# Altium footprint library RPi.PcbLib: 4 footprints
Each footprint in its own frame and in the unit in brackets; x right, y up, seen from the top. Pads: shape width x height; smd on the part's side, far side on the other; paste and mask are expansions set on the pad; w line width, h text height; cw(c..) or ccw(c..) is an arc to the next point about the centre after c.
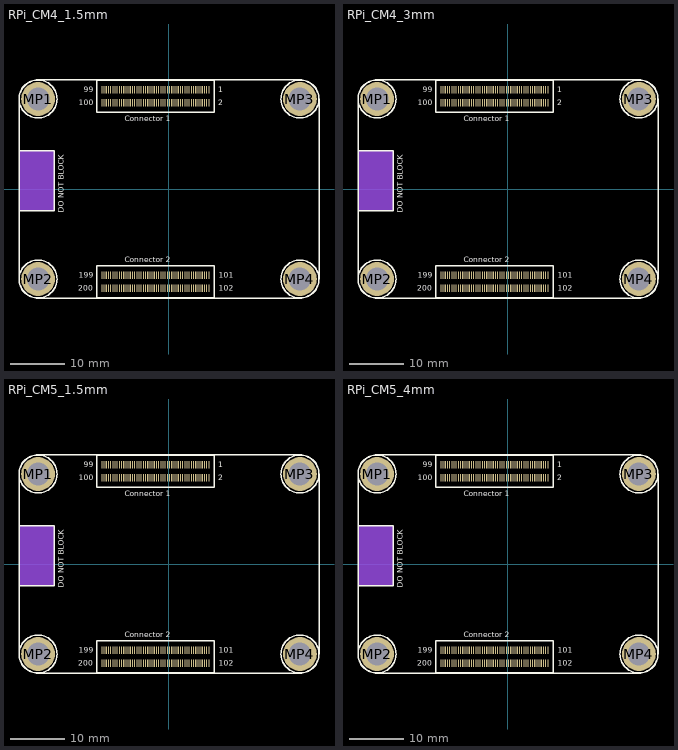
[diagram p0: the footprints below, top view; thin cyan lines are the x and y axes]

## RPi_CM4_1.5mm [mm] "Raspberry Pi compute module 4 footprint with mounting holes for SMTSO-M25-XET series. It is to be used with two DF40C-100DS-0.4v connectors."
pads (204):
  rect 0.2x1.4 smd paste+0 mask+0: 1(7.3,18.2) 2(7.3,15.82) 3(6.9,18.2) 4(6.9,15.82) 5(6.5,18.2) 6(6.5,15.82) 7(6.1,18.2) 8(6.1,15.82) 9(5.7,18.2) 10(5.7,15.82) 11(5.3,18.2) 12(5.3,15.82) 13(4.9,18.2) 14(4.9,15.82) 15(4.5,18.2) 16(4.5,15.82) 17(4.1,18.2) 18(4.1,15.82) 19(3.7,18.2) 20(3.7,15.82) 21(3.3,18.2) 22(3.3,15.82) 23(2.9,18.2) 24(2.9,15.82) 25(2.5,18.2) 26(2.5,15.82) 27(2.1,18.2) 28(2.1,15.82) 29(1.7,18.2) 30(1.7,15.82) 31(1.3,18.2) 32(1.3,15.82) 33(0.9,18.2) 34(0.9,15.82) 35(0.5,18.2) 36(0.5,15.82) 37(0.1,18.2) 38(0.1,15.82) 39(-0.3,18.2) 40(-0.3,15.82) 41(-0.7,18.2) 42(-0.7,15.82) 43(-1.1,18.2) 44(-1.1,15.82) 45(-1.5,18.2) 46(-1.5,15.82) 47(-1.9,18.2) 48(-1.9,15.82) 49(-2.3,18.2) 50(-2.3,15.82) 51(-2.7,18.2) 52(-2.7,15.82) 53(-3.1,18.2) 54(-3.1,15.82) 55(-3.5,18.2) 56(-3.5,15.82) 57(-3.9,18.2) 58(-3.9,15.82) 59(-4.3,18.2) 60(-4.3,15.82) 61(-4.7,18.2) 62(-4.7,15.82) 63(-5.1,18.2) 64(-5.1,15.82) 65(-5.5,18.2) 66(-5.5,15.82) 67(-5.9,18.2) 68(-5.9,15.82) 69(-6.3,18.2) 70(-6.3,15.82) 71(-6.7,18.2) 72(-6.7,15.82) 73(-7.1,18.2) 74(-7.1,15.82) 75(-7.5,18.2) 76(-7.5,15.82) 77(-7.9,18.2) 78(-7.9,15.82) 79(-8.3,18.2) 80(-8.3,15.82) 81(-8.7,18.2) 82(-8.7,15.82) 83(-9.1,18.2) 84(-9.1,15.82) 85(-9.5,18.2) 86(-9.5,15.82) 87(-9.9,18.2) 88(-9.9,15.82) 89(-10.3,18.2) 90(-10.3,15.82) 91(-10.7,18.2) 92(-10.7,15.82) 93(-11.1,18.2) 94(-11.1,15.82) 95(-11.5,18.2) 96(-11.5,15.82) 97(-11.9,18.2) 98(-11.9,15.82) 99(-12.3,18.2) 100(-12.3,15.82) 101(7.3,-15.82) 102(7.3,-18.2) 103(6.9,-15.82) 104(6.9,-18.2) 105(6.5,-15.82) 106(6.5,-18.2) 107(6.1,-15.82) 108(6.1,-18.2) 109(5.7,-15.82) 110(5.7,-18.2) 111(5.3,-15.82) 112(5.3,-18.2) 113(4.9,-15.82) 114(4.9,-18.2) 115(4.5,-15.82) 116(4.5,-18.2) 117(4.1,-15.82) 118(4.1,-18.2) 119(3.7,-15.82) 120(3.7,-18.2) 121(3.3,-15.82) 122(3.3,-18.2) 123(2.9,-15.82) 124(2.9,-18.2) 125(2.5,-15.82) 126(2.5,-18.2) 127(2.1,-15.82) 128(2.1,-18.2) 129(1.7,-15.82) 130(1.7,-18.2) 131(1.3,-15.82) 132(1.3,-18.2) 133(0.9,-15.82) 134(0.9,-18.2) 135(0.5,-15.82) 136(0.5,-18.2) 137(0.1,-15.82) 138(0.1,-18.2) 139(-0.3,-15.82) 140(-0.3,-18.2) 141(-0.7,-15.82) 142(-0.7,-18.2) 143(-1.1,-15.82) 144(-1.1,-18.2) 145(-1.5,-15.82) 146(-1.5,-18.2) 147(-1.9,-15.82) 148(-1.9,-18.2) 149(-2.3,-15.82) 150(-2.3,-18.2) 151(-2.7,-15.82) 152(-2.7,-18.2) 153(-3.1,-15.82) 154(-3.1,-18.2) 155(-3.5,-15.82) 156(-3.5,-18.2) 157(-3.9,-15.82) 158(-3.9,-18.2) 159(-4.3,-15.82) 160(-4.3,-18.2) 161(-4.7,-15.82) 162(-4.7,-18.2) 163(-5.1,-15.82) 164(-5.1,-18.2) 165(-5.5,-15.82) 166(-5.5,-18.2) 167(-5.9,-15.82) 168(-5.9,-18.2) 169(-6.3,-15.82) 170(-6.3,-18.2) 171(-6.7,-15.82) 172(-6.7,-18.2) 173(-7.1,-15.82) 174(-7.1,-18.2) 175(-7.5,-15.82) 176(-7.5,-18.2) 177(-7.9,-15.82) 178(-7.9,-18.2) 179(-8.3,-15.82) 180(-8.3,-18.2) 181(-8.7,-15.82) 182(-8.7,-18.2) 183(-9.1,-15.82) 184(-9.1,-18.2) 185(-9.5,-15.82) 186(-9.5,-18.2) 187(-9.9,-15.82) 188(-9.9,-18.2) 189(-10.3,-15.82) 190(-10.3,-18.2) 191(-10.7,-15.82) 192(-10.7,-18.2) 193(-11.1,-15.82) 194(-11.1,-18.2) 195(-11.5,-15.82) 196(-11.5,-18.2) 197(-11.9,-15.82) 198(-11.9,-18.2) 199(-12.3,-15.82) 200(-12.3,-18.2)
  round 6.2 hole 4.15 paste-2539.97 mask+0: MP1(-24,16.5) MP2(-24,-16.5) MP3(24,16.5) MP4(24,-16.5)
Top Layer keep-out:
  rectangle: -27.5,-4 -21,7
Bottom Layer keep-out:
  rectangle: -27.5,-4 -21,7
Top Overlay:
  circle w0.254: c24,16.5 r3.47
  circle w0.254: c24,-16.5 r3.47
  circle w0.254: c-24,-16.5 r3.47
  circle w0.254: c-24,16.5 r3.47
  lines w0.254: -27.483,-4.013 -21.006,-4.013 -21.006,7.01 -27.483,7.01 ; -27.5,-16.5 ccw(c-24,-16.5) -24,-20 24,-20 ccw(c24,-16.5) 27.5,-16.5 27.5,16.5 ccw(c24,16.5) 24,20 -24,20 ccw(c-24,16.5) -27.5,16.5 -27.5,-16.5 ; -13.208,-19.939 -13.208,-14.097 8.255,-14.097 8.255,-19.939 -13.208,-19.939 ; -13.208,14.097 -13.208,19.939 8.255,19.939 8.255,14.097 -13.208,14.097
  text "Connector 1" at -8.128,12.446 h1
  text "Connector 2" at -8.128,-13.462 h1
  text "DO NOT BLOCK" at -19.304,-4.318 h1
  text "1" at 9.017,17.78 h1
  text "2" at 9.017,15.367 h1
  text "99" at -15.621,17.78 h1
  text "100" at -16.51,15.367 h1
  text "101" at 9.144,-16.256 h1
  text "102" at 9.144,-18.669 h1
  text "199" at -16.51,-16.256 h1
  text "200" at -16.637,-18.669 h1
3D body "RaspberryPi_CM4_WithReceptacleH1.5mm.step": height 5.08, standoff 0, extent -27.5,-20 27.5,20

## RPi_CM4_3mm [mm] "Raspberry Pi compute module 4 footprint with mounting holes for SMTSO-M25-3ET. It is to be used with two DF40HC(3.0)-100DS-0.4V(51) connectors."
pads (204):
  rect 0.2x1.4 smd paste+0 mask+0: 1(7.3,18.2) 2(7.3,15.82) 3(6.9,18.2) 4(6.9,15.82) 5(6.5,18.2) 6(6.5,15.82) 7(6.1,18.2) 8(6.1,15.82) 9(5.7,18.2) 10(5.7,15.82) 11(5.3,18.2) 12(5.3,15.82) 13(4.9,18.2) 14(4.9,15.82) 15(4.5,18.2) 16(4.5,15.82) 17(4.1,18.2) 18(4.1,15.82) 19(3.7,18.2) 20(3.7,15.82) 21(3.3,18.2) 22(3.3,15.82) 23(2.9,18.2) 24(2.9,15.82) 25(2.5,18.2) 26(2.5,15.82) 27(2.1,18.2) 28(2.1,15.82) 29(1.7,18.2) 30(1.7,15.82) 31(1.3,18.2) 32(1.3,15.82) 33(0.9,18.2) 34(0.9,15.82) 35(0.5,18.2) 36(0.5,15.82) 37(0.1,18.2) 38(0.1,15.82) 39(-0.3,18.2) 40(-0.3,15.82) 41(-0.7,18.2) 42(-0.7,15.82) 43(-1.1,18.2) 44(-1.1,15.82) 45(-1.5,18.2) 46(-1.5,15.82) 47(-1.9,18.2) 48(-1.9,15.82) 49(-2.3,18.2) 50(-2.3,15.82) 51(-2.7,18.2) 52(-2.7,15.82) 53(-3.1,18.2) 54(-3.1,15.82) 55(-3.5,18.2) 56(-3.5,15.82) 57(-3.9,18.2) 58(-3.9,15.82) 59(-4.3,18.2) 60(-4.3,15.82) 61(-4.7,18.2) 62(-4.7,15.82) 63(-5.1,18.2) 64(-5.1,15.82) 65(-5.5,18.2) 66(-5.5,15.82) 67(-5.9,18.2) 68(-5.9,15.82) 69(-6.3,18.2) 70(-6.3,15.82) 71(-6.7,18.2) 72(-6.7,15.82) 73(-7.1,18.2) 74(-7.1,15.82) 75(-7.5,18.2) 76(-7.5,15.82) 77(-7.9,18.2) 78(-7.9,15.82) 79(-8.3,18.2) 80(-8.3,15.82) 81(-8.7,18.2) 82(-8.7,15.82) 83(-9.1,18.2) 84(-9.1,15.82) 85(-9.5,18.2) 86(-9.5,15.82) 87(-9.9,18.2) 88(-9.9,15.82) 89(-10.3,18.2) 90(-10.3,15.82) 91(-10.7,18.2) 92(-10.7,15.82) 93(-11.1,18.2) 94(-11.1,15.82) 95(-11.5,18.2) 96(-11.5,15.82) 97(-11.9,18.2) 98(-11.9,15.82) 99(-12.3,18.2) 100(-12.3,15.82) 101(7.3,-15.82) 102(7.3,-18.2) 103(6.9,-15.82) 104(6.9,-18.2) 105(6.5,-15.82) 106(6.5,-18.2) 107(6.1,-15.82) 108(6.1,-18.2) 109(5.7,-15.82) 110(5.7,-18.2) 111(5.3,-15.82) 112(5.3,-18.2) 113(4.9,-15.82) 114(4.9,-18.2) 115(4.5,-15.82) 116(4.5,-18.2) 117(4.1,-15.82) 118(4.1,-18.2) 119(3.7,-15.82) 120(3.7,-18.2) 121(3.3,-15.82) 122(3.3,-18.2) 123(2.9,-15.82) 124(2.9,-18.2) 125(2.5,-15.82) 126(2.5,-18.2) 127(2.1,-15.82) 128(2.1,-18.2) 129(1.7,-15.82) 130(1.7,-18.2) 131(1.3,-15.82) 132(1.3,-18.2) 133(0.9,-15.82) 134(0.9,-18.2) 135(0.5,-15.82) 136(0.5,-18.2) 137(0.1,-15.82) 138(0.1,-18.2) 139(-0.3,-15.82) 140(-0.3,-18.2) 141(-0.7,-15.82) 142(-0.7,-18.2) 143(-1.1,-15.82) 144(-1.1,-18.2) 145(-1.5,-15.82) 146(-1.5,-18.2) 147(-1.9,-15.82) 148(-1.9,-18.2) 149(-2.3,-15.82) 150(-2.3,-18.2) 151(-2.7,-15.82) 152(-2.7,-18.2) 153(-3.1,-15.82) 154(-3.1,-18.2) 155(-3.5,-15.82) 156(-3.5,-18.2) 157(-3.9,-15.82) 158(-3.9,-18.2) 159(-4.3,-15.82) 160(-4.3,-18.2) 161(-4.7,-15.82) 162(-4.7,-18.2) 163(-5.1,-15.82) 164(-5.1,-18.2) 165(-5.5,-15.82) 166(-5.5,-18.2) 167(-5.9,-15.82) 168(-5.9,-18.2) 169(-6.3,-15.82) 170(-6.3,-18.2) 171(-6.7,-15.82) 172(-6.7,-18.2) 173(-7.1,-15.82) 174(-7.1,-18.2) 175(-7.5,-15.82) 176(-7.5,-18.2) 177(-7.9,-15.82) 178(-7.9,-18.2) 179(-8.3,-15.82) 180(-8.3,-18.2) 181(-8.7,-15.82) 182(-8.7,-18.2) 183(-9.1,-15.82) 184(-9.1,-18.2) 185(-9.5,-15.82) 186(-9.5,-18.2) 187(-9.9,-15.82) 188(-9.9,-18.2) 189(-10.3,-15.82) 190(-10.3,-18.2) 191(-10.7,-15.82) 192(-10.7,-18.2) 193(-11.1,-15.82) 194(-11.1,-18.2) 195(-11.5,-15.82) 196(-11.5,-18.2) 197(-11.9,-15.82) 198(-11.9,-18.2) 199(-12.3,-15.82) 200(-12.3,-18.2)
  round 6.2 hole 4.15 paste-2539.97 mask+0: MP1(-24,16.5) MP2(-24,-16.5) MP3(24,16.5) MP4(24,-16.5)
Top Layer keep-out:
  rectangle: -27.5,-4 -21,7
Bottom Layer keep-out:
  rectangle: -27.5,-4 -21,7
Top Overlay:
  circle w0.254: c-24,16.5 r3.47
  circle w0.254: c-24,-16.5 r3.47
  circle w0.254: c24,-16.5 r3.47
  circle w0.254: c24,16.5 r3.47
  lines w0.254: -27.483,-4.013 -21.006,-4.013 -21.006,7.01 -27.483,7.01 ; -27.5,-16.5 ccw(c-24,-16.5) -24,-20 24,-20 ccw(c24,-16.5) 27.5,-16.5 27.5,16.5 ccw(c24,16.5) 24,20 -24,20 ccw(c-24,16.5) -27.5,16.5 -27.5,-16.5 ; -13.208,-19.939 8.255,-19.939 8.255,-14.097 -13.208,-14.097 -13.208,-19.939 ; -13.208,14.097 8.255,14.097 8.255,19.939 -13.208,19.939 -13.208,14.097
  text "200" at -16.637,-18.669 h1
  text "199" at -16.51,-16.256 h1
  text "102" at 9.144,-18.669 h1
  text "101" at 9.144,-16.256 h1
  text "100" at -16.51,15.367 h1
  text "99" at -15.621,17.78 h1
  text "2" at 9.017,15.367 h1
  text "1" at 9.017,17.78 h1
  text "DO NOT BLOCK" at -19.304,-4.318 h1
  text "Connector 2" at -8.128,-13.462 h1
  text "Connector 1" at -8.128,12.446 h1
3D body "RaspberryPi_CM4.step": height 6.59, standoff 1.86, extent -27.492,-20 27.508,20
3D body "DF40HC(3.0)-100DS-0.4V.stp": height 2.9, standoff 0, extent -13.795,-18.706 8.805,-15.326
3D body "DF40HC(3.0)-100DS-0.4V.stp": height 2.9, standoff 0, extent -13.795,15.328 8.805,18.708
3D body "SMTSO-M25-3ET-PennEngineering-3D-03-13-2026.stp": height 3.03, standoff -1.5, extent -26.78,13.732 -21.22,19.268
3D body "SMTSO-M25-3ET-PennEngineering-3D-03-13-2026.stp": height 3.03, standoff -1.5, extent 21.22,13.732 26.78,19.268
3D body "SMTSO-M25-3ET-PennEngineering-3D-03-13-2026.stp": height 3.03, standoff -1.5, extent -26.78,-19.268 -21.22,-13.732
3D body "SMTSO-M25-3ET-PennEngineering-3D-03-13-2026.stp": height 3.03, standoff -1.5, extent 21.22,-19.268 26.78,-13.732

## RPi_CM5_1.5mm [mm] "Raspberry Pi compute module 5 footprint with mounting holes for SMTSO-M25-XET series. It is to be used with two 10164227-1001A1RLF connectors."
pads (204):
  rect 0.2x1.4 smd paste+0 mask+0: 1(7.3,18.2) 2(7.3,15.82) 3(6.9,18.2) 4(6.9,15.82) 5(6.5,18.2) 6(6.5,15.82) 7(6.1,18.2) 8(6.1,15.82) 9(5.7,18.2) 10(5.7,15.82) 11(5.3,18.2) 12(5.3,15.82) 13(4.9,18.2) 14(4.9,15.82) 15(4.5,18.2) 16(4.5,15.82) 17(4.1,18.2) 18(4.1,15.82) 19(3.7,18.2) 20(3.7,15.82) 21(3.3,18.2) 22(3.3,15.82) 23(2.9,18.2) 24(2.9,15.82) 25(2.5,18.2) 26(2.5,15.82) 27(2.1,18.2) 28(2.1,15.82) 29(1.7,18.2) 30(1.7,15.82) 31(1.3,18.2) 32(1.3,15.82) 33(0.9,18.2) 34(0.9,15.82) 35(0.5,18.2) 36(0.5,15.82) 37(0.1,18.2) 38(0.1,15.82) 39(-0.3,18.2) 40(-0.3,15.82) 41(-0.7,18.2) 42(-0.7,15.82) 43(-1.1,18.2) 44(-1.1,15.82) 45(-1.5,18.2) 46(-1.5,15.82) 47(-1.9,18.2) 48(-1.9,15.82) 49(-2.3,18.2) 50(-2.3,15.82) 51(-2.7,18.2) 52(-2.7,15.82) 53(-3.1,18.2) 54(-3.1,15.82) 55(-3.5,18.2) 56(-3.5,15.82) 57(-3.9,18.2) 58(-3.9,15.82) 59(-4.3,18.2) 60(-4.3,15.82) 61(-4.7,18.2) 62(-4.7,15.82) 63(-5.1,18.2) 64(-5.1,15.82) 65(-5.5,18.2) 66(-5.5,15.82) 67(-5.9,18.2) 68(-5.9,15.82) 69(-6.3,18.2) 70(-6.3,15.82) 71(-6.7,18.2) 72(-6.7,15.82) 73(-7.1,18.2) 74(-7.1,15.82) 75(-7.5,18.2) 76(-7.5,15.82) 77(-7.9,18.2) 78(-7.9,15.82) 79(-8.3,18.2) 80(-8.3,15.82) 81(-8.7,18.2) 82(-8.7,15.82) 83(-9.1,18.2) 84(-9.1,15.82) 85(-9.5,18.2) 86(-9.5,15.82) 87(-9.9,18.2) 88(-9.9,15.82) 89(-10.3,18.2) 90(-10.3,15.82) 91(-10.7,18.2) 92(-10.7,15.82) 93(-11.1,18.2) 94(-11.1,15.82) 95(-11.5,18.2) 96(-11.5,15.82) 97(-11.9,18.2) 98(-11.9,15.82) 99(-12.3,18.2) 100(-12.3,15.82) 101(7.3,-15.82) 102(7.3,-18.2) 103(6.9,-15.82) 104(6.9,-18.2) 105(6.5,-15.82) 106(6.5,-18.2) 107(6.1,-15.82) 108(6.1,-18.2) 109(5.7,-15.82) 110(5.7,-18.2) 111(5.3,-15.82) 112(5.3,-18.2) 113(4.9,-15.82) 114(4.9,-18.2) 115(4.5,-15.82) 116(4.5,-18.2) 117(4.1,-15.82) 118(4.1,-18.2) 119(3.7,-15.82) 120(3.7,-18.2) 121(3.3,-15.82) 122(3.3,-18.2) 123(2.9,-15.82) 124(2.9,-18.2) 125(2.5,-15.82) 126(2.5,-18.2) 127(2.1,-15.82) 128(2.1,-18.2) 129(1.7,-15.82) 130(1.7,-18.2) 131(1.3,-15.82) 132(1.3,-18.2) 133(0.9,-15.82) 134(0.9,-18.2) 135(0.5,-15.82) 136(0.5,-18.2) 137(0.1,-15.82) 138(0.1,-18.2) 139(-0.3,-15.82) 140(-0.3,-18.2) 141(-0.7,-15.82) 142(-0.7,-18.2) 143(-1.1,-15.82) 144(-1.1,-18.2) 145(-1.5,-15.82) 146(-1.5,-18.2) 147(-1.9,-15.82) 148(-1.9,-18.2) 149(-2.3,-15.82) 150(-2.3,-18.2) 151(-2.7,-15.82) 152(-2.7,-18.2) 153(-3.1,-15.82) 154(-3.1,-18.2) 155(-3.5,-15.82) 156(-3.5,-18.2) 157(-3.9,-15.82) 158(-3.9,-18.2) 159(-4.3,-15.82) 160(-4.3,-18.2) 161(-4.7,-15.82) 162(-4.7,-18.2) 163(-5.1,-15.82) 164(-5.1,-18.2) 165(-5.5,-15.82) 166(-5.5,-18.2) 167(-5.9,-15.82) 168(-5.9,-18.2) 169(-6.3,-15.82) 170(-6.3,-18.2) 171(-6.7,-15.82) 172(-6.7,-18.2) 173(-7.1,-15.82) 174(-7.1,-18.2) 175(-7.5,-15.82) 176(-7.5,-18.2) 177(-7.9,-15.82) 178(-7.9,-18.2) 179(-8.3,-15.82) 180(-8.3,-18.2) 181(-8.7,-15.82) 182(-8.7,-18.2) 183(-9.1,-15.82) 184(-9.1,-18.2) 185(-9.5,-15.82) 186(-9.5,-18.2) 187(-9.9,-15.82) 188(-9.9,-18.2) 189(-10.3,-15.82) 190(-10.3,-18.2) 191(-10.7,-15.82) 192(-10.7,-18.2) 193(-11.1,-15.82) 194(-11.1,-18.2) 195(-11.5,-15.82) 196(-11.5,-18.2) 197(-11.9,-15.82) 198(-11.9,-18.2) 199(-12.3,-15.82) 200(-12.3,-18.2)
  round 6.2 hole 4.15 paste-2539.97 mask+0: MP1(-24,16.5) MP2(-24,-16.5) MP3(24,16.5) MP4(24,-16.5)
Top Layer keep-out:
  rectangle: -27.5,-4 -21,7
Bottom Layer keep-out:
  rectangle: -27.5,-4 -21,7
Top Overlay:
  circle w0.254: c-24,16.5 r3.47
  circle w0.254: c-24,-16.5 r3.47
  circle w0.254: c24,-16.5 r3.47
  circle w0.254: c24,16.5 r3.47
  lines w0.254: -27.483,-4.013 -21.006,-4.013 -21.006,7.01 -27.483,7.01 ; -27.5,-16.5 ccw(c-24,-16.5) -24,-20 24,-20 ccw(c24,-16.5) 27.5,-16.5 27.5,16.5 ccw(c24,16.5) 24,20 -24,20 ccw(c-24,16.5) -27.5,16.5 -27.5,-16.5 ; -13.208,-19.939 8.255,-19.939 8.255,-14.097 -13.208,-14.097 -13.208,-19.939 ; -13.208,14.097 8.255,14.097 8.255,19.939 -13.208,19.939 -13.208,14.097
  text "200" at -16.637,-18.669 h1
  text "199" at -16.51,-16.256 h1
  text "102" at 9.144,-18.669 h1
  text "101" at 9.144,-16.256 h1
  text "100" at -16.51,15.367 h1
  text "99" at -15.621,17.78 h1
  text "2" at 9.017,15.367 h1
  text "1" at 9.017,17.78 h1
  text "DO NOT BLOCK" at -19.304,-4.318 h1
  text "Connector 2" at -8.128,-13.462 h1
  text "Connector 1" at -8.128,12.446 h1
3D body "CM5R5-3dsteps.step": height 5.01, standoff 0.39, extent -27.457,-20.051 27.543,19.949
3D body "10164227-1001a1rlf.stp": height -0.39, standoff -1.84, extent -13.8,15.31 8.8,18.69
3D body "10164227-1001a1rlf.stp": height -0.39, standoff -1.84, extent -13.8,-18.69 8.8,-15.31

## RPi_CM5_4mm [mm] "Raspberry Pi compute module 5 footprint with mounting holes for SMTSO-M25-4ET. It is to be used with two 10164227-1004A1RLF connectors."
pads (204):
  rect 0.2x1.4 smd paste+0 mask+0: 1(7.3,18.2) 2(7.3,15.82) 3(6.9,18.2) 4(6.9,15.82) 5(6.5,18.2) 6(6.5,15.82) 7(6.1,18.2) 8(6.1,15.82) 9(5.7,18.2) 10(5.7,15.82) 11(5.3,18.2) 12(5.3,15.82) 13(4.9,18.2) 14(4.9,15.82) 15(4.5,18.2) 16(4.5,15.82) 17(4.1,18.2) 18(4.1,15.82) 19(3.7,18.2) 20(3.7,15.82) 21(3.3,18.2) 22(3.3,15.82) 23(2.9,18.2) 24(2.9,15.82) 25(2.5,18.2) 26(2.5,15.82) 27(2.1,18.2) 28(2.1,15.82) 29(1.7,18.2) 30(1.7,15.82) 31(1.3,18.2) 32(1.3,15.82) 33(0.9,18.2) 34(0.9,15.82) 35(0.5,18.2) 36(0.5,15.82) 37(0.1,18.2) 38(0.1,15.82) 39(-0.3,18.2) 40(-0.3,15.82) 41(-0.7,18.2) 42(-0.7,15.82) 43(-1.1,18.2) 44(-1.1,15.82) 45(-1.5,18.2) 46(-1.5,15.82) 47(-1.9,18.2) 48(-1.9,15.82) 49(-2.3,18.2) 50(-2.3,15.82) 51(-2.7,18.2) 52(-2.7,15.82) 53(-3.1,18.2) 54(-3.1,15.82) 55(-3.5,18.2) 56(-3.5,15.82) 57(-3.9,18.2) 58(-3.9,15.82) 59(-4.3,18.2) 60(-4.3,15.82) 61(-4.7,18.2) 62(-4.7,15.82) 63(-5.1,18.2) 64(-5.1,15.82) 65(-5.5,18.2) 66(-5.5,15.82) 67(-5.9,18.2) 68(-5.9,15.82) 69(-6.3,18.2) 70(-6.3,15.82) 71(-6.7,18.2) 72(-6.7,15.82) 73(-7.1,18.2) 74(-7.1,15.82) 75(-7.5,18.2) 76(-7.5,15.82) 77(-7.9,18.2) 78(-7.9,15.82) 79(-8.3,18.2) 80(-8.3,15.82) 81(-8.7,18.2) 82(-8.7,15.82) 83(-9.1,18.2) 84(-9.1,15.82) 85(-9.5,18.2) 86(-9.5,15.82) 87(-9.9,18.2) 88(-9.9,15.82) 89(-10.3,18.2) 90(-10.3,15.82) 91(-10.7,18.2) 92(-10.7,15.82) 93(-11.1,18.2) 94(-11.1,15.82) 95(-11.5,18.2) 96(-11.5,15.82) 97(-11.9,18.2) 98(-11.9,15.82) 99(-12.3,18.2) 100(-12.3,15.82) 101(7.3,-15.82) 102(7.3,-18.2) 103(6.9,-15.82) 104(6.9,-18.2) 105(6.5,-15.82) 106(6.5,-18.2) 107(6.1,-15.82) 108(6.1,-18.2) 109(5.7,-15.82) 110(5.7,-18.2) 111(5.3,-15.82) 112(5.3,-18.2) 113(4.9,-15.82) 114(4.9,-18.2) 115(4.5,-15.82) 116(4.5,-18.2) 117(4.1,-15.82) 118(4.1,-18.2) 119(3.7,-15.82) 120(3.7,-18.2) 121(3.3,-15.82) 122(3.3,-18.2) 123(2.9,-15.82) 124(2.9,-18.2) 125(2.5,-15.82) 126(2.5,-18.2) 127(2.1,-15.82) 128(2.1,-18.2) 129(1.7,-15.82) 130(1.7,-18.2) 131(1.3,-15.82) 132(1.3,-18.2) 133(0.9,-15.82) 134(0.9,-18.2) 135(0.5,-15.82) 136(0.5,-18.2) 137(0.1,-15.82) 138(0.1,-18.2) 139(-0.3,-15.82) 140(-0.3,-18.2) 141(-0.7,-15.82) 142(-0.7,-18.2) 143(-1.1,-15.82) 144(-1.1,-18.2) 145(-1.5,-15.82) 146(-1.5,-18.2) 147(-1.9,-15.82) 148(-1.9,-18.2) 149(-2.3,-15.82) 150(-2.3,-18.2) 151(-2.7,-15.82) 152(-2.7,-18.2) 153(-3.1,-15.82) 154(-3.1,-18.2) 155(-3.5,-15.82) 156(-3.5,-18.2) 157(-3.9,-15.82) 158(-3.9,-18.2) 159(-4.3,-15.82) 160(-4.3,-18.2) 161(-4.7,-15.82) 162(-4.7,-18.2) 163(-5.1,-15.82) 164(-5.1,-18.2) 165(-5.5,-15.82) 166(-5.5,-18.2) 167(-5.9,-15.82) 168(-5.9,-18.2) 169(-6.3,-15.82) 170(-6.3,-18.2) 171(-6.7,-15.82) 172(-6.7,-18.2) 173(-7.1,-15.82) 174(-7.1,-18.2) 175(-7.5,-15.82) 176(-7.5,-18.2) 177(-7.9,-15.82) 178(-7.9,-18.2) 179(-8.3,-15.82) 180(-8.3,-18.2) 181(-8.7,-15.82) 182(-8.7,-18.2) 183(-9.1,-15.82) 184(-9.1,-18.2) 185(-9.5,-15.82) 186(-9.5,-18.2) 187(-9.9,-15.82) 188(-9.9,-18.2) 189(-10.3,-15.82) 190(-10.3,-18.2) 191(-10.7,-15.82) 192(-10.7,-18.2) 193(-11.1,-15.82) 194(-11.1,-18.2) 195(-11.5,-15.82) 196(-11.5,-18.2) 197(-11.9,-15.82) 198(-11.9,-18.2) 199(-12.3,-15.82) 200(-12.3,-18.2)
  round 6.2 hole 4.15 paste-2539.97 mask+0: MP1(-24,16.5) MP2(-24,-16.5) MP3(24,16.5) MP4(24,-16.5)
Top Layer keep-out:
  rectangle: -27.5,-4 -21,7
Bottom Layer keep-out:
  rectangle: -27.5,-4 -21,7
Top Overlay:
  circle w0.254: c24,16.5 r3.47
  circle w0.254: c24,-16.5 r3.47
  circle w0.254: c-24,-16.5 r3.47
  circle w0.254: c-24,16.5 r3.47
  lines w0.254: -27.483,-4.013 -21.006,-4.013 -21.006,7.01 -27.483,7.01 ; -27.5,-16.5 ccw(c-24,-16.5) -24,-20 24,-20 ccw(c24,-16.5) 27.5,-16.5 27.5,16.5 ccw(c24,16.5) 24,20 -24,20 ccw(c-24,16.5) -27.5,16.5 -27.5,-16.5 ; -13.208,-19.939 -13.208,-14.097 8.255,-14.097 8.255,-19.939 -13.208,-19.939 ; -13.208,14.097 -13.208,19.939 8.255,19.939 8.255,14.097 -13.208,14.097
  text "Connector 1" at -8.128,12.446 h1
  text "Connector 2" at -8.128,-13.462 h1
  text "DO NOT BLOCK" at -19.304,-4.318 h1
  text "1" at 9.017,17.78 h1
  text "2" at 9.017,15.367 h1
  text "99" at -15.621,17.78 h1
  text "100" at -16.51,15.367 h1
  text "101" at 9.144,-16.256 h1
  text "102" at 9.144,-18.669 h1
  text "199" at -16.51,-16.256 h1
  text "200" at -16.637,-18.669 h1
3D body "SMTSO-M25-4ET-PennEngineering-3D-03-13-2026.stp": height 4.03, standoff -1.5, extent -26.78,13.732 -21.22,19.268
3D body "SMTSO-M25-4ET-PennEngineering-3D-03-13-2026.stp": height 4.03, standoff -1.5, extent 21.22,13.732 26.78,19.268
3D body "SMTSO-M25-4ET-PennEngineering-3D-03-13-2026.stp": height 4.03, standoff -1.5, extent -26.78,-19.268 -21.22,-13.732
3D body "SMTSO-M25-4ET-PennEngineering-3D-03-13-2026.stp": height 4.03, standoff -1.5, extent 21.22,-19.268 26.78,-13.732
3D body "CM5R5-3dsteps.step": height 7.51, standoff 2.89, extent -27.457,-20.051 27.543,19.949
3D body "10164227-1004a1rlf.stp": height -0.39, standoff -4.29, extent -13.8,-18.69 8.8,-15.31
3D body "10164227-1004a1rlf.stp": height -0.39, standoff -4.29, extent -13.8,15.31 8.8,18.69